# Altium footprint library ref-packages-longpad.PCBLIB: 1527 footprints (part 56 of 103)
Each footprint in its own frame and in the unit in brackets; x right, y up, seen from the top. Pads: shape width x height; smd on the part's side, far side on the other; paste and mask are expansions set on the pad; w line width, h text height; cw(c..) or ccw(c..) is an arc to the next point about the centre after c.
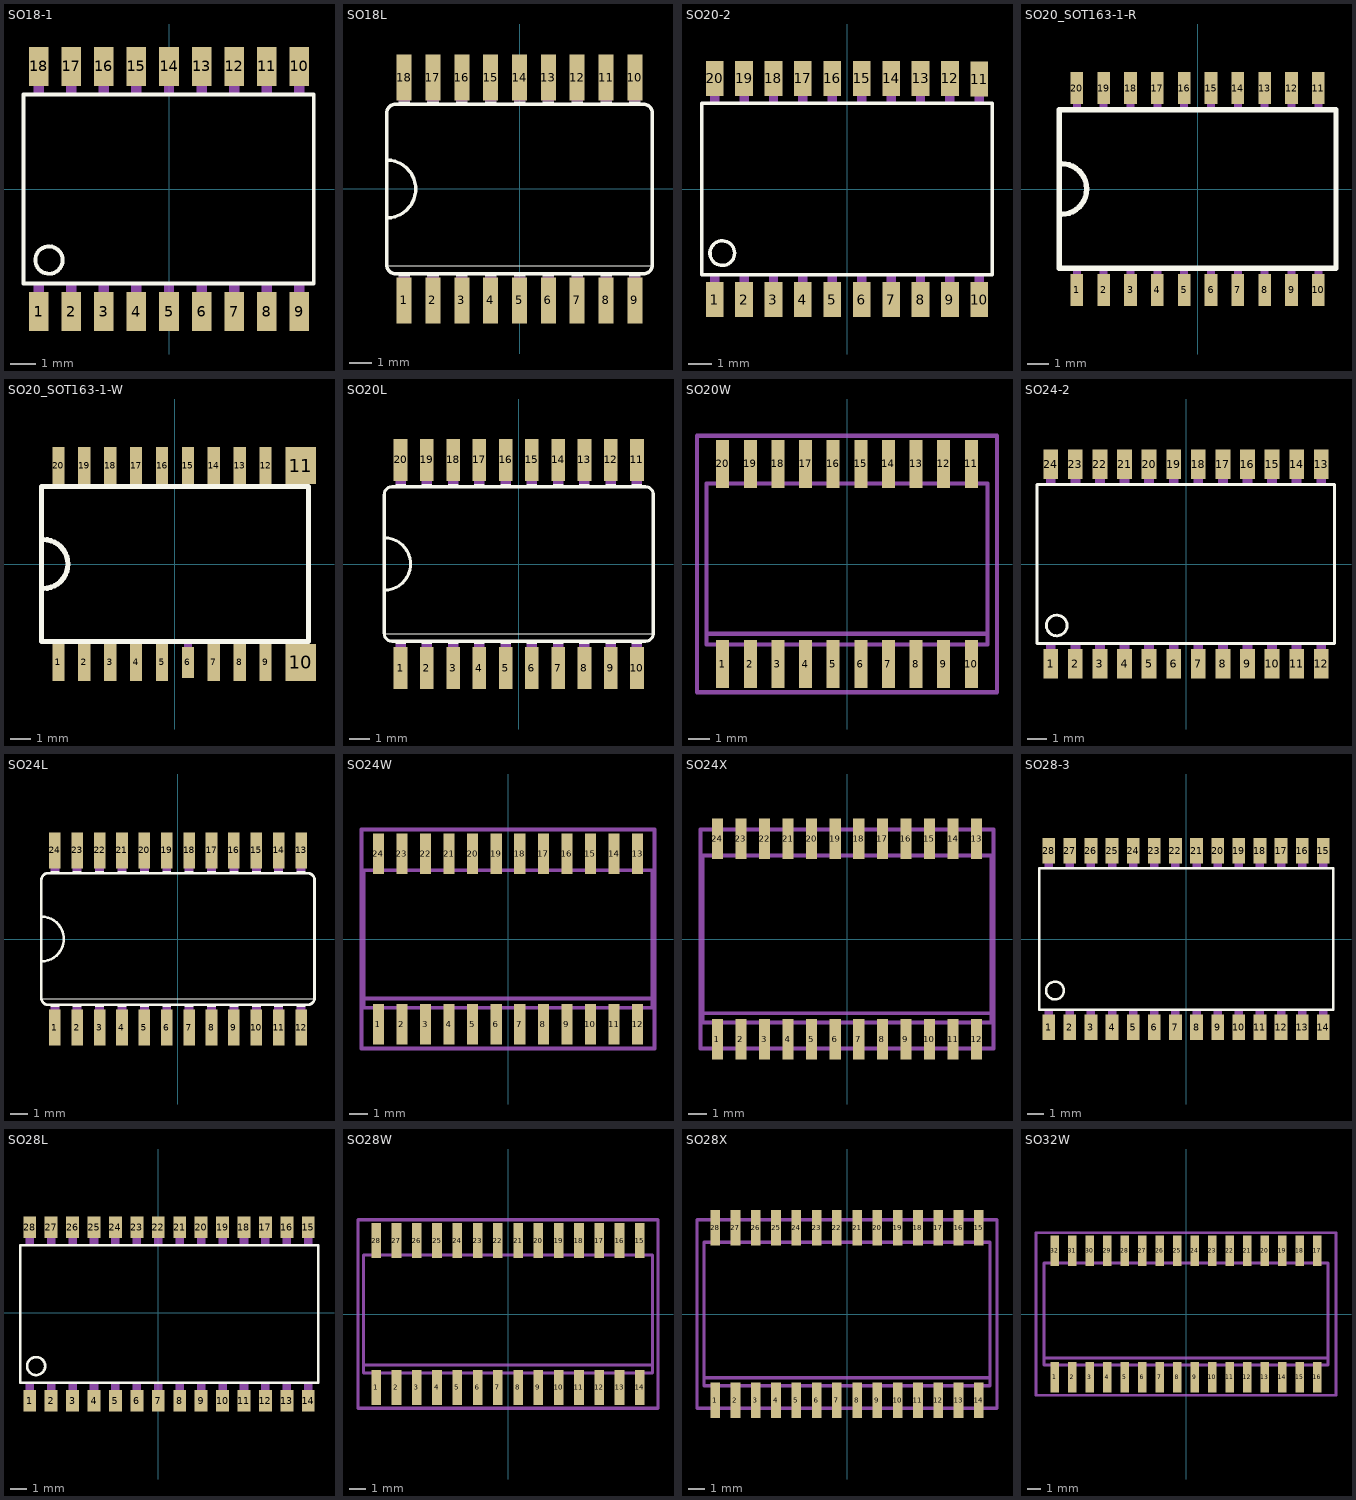
[diagram p55: the footprints below, top view; thin cyan lines are the x and y axes]

## SO18-1 [mil]
pads (18):
  rect 30x60 smd: 1(-200,-188) 2(-150,-188) 3(-100,-188) 4(-50,-188) 5(0,-188) 6(50,-188) 7(100,-188) 8(150,-188) 9(200,-188) 10(200,188) 11(150,188) 12(100,188) 13(50,188) 14(0,188) 15(-50,188) 16(-100,188) 17(-150,188) 18(-200,188)
Top Overlay:
  circle w6: c-184,-109 r21
  lines w6: -223,-145 222,-145 222,145 -223,145 -223,-145
Mechanical 16:
  rectangle: 192,147 208,200
  rectangle: 142,147 158,200
  rectangle: 92,147 108,200
  rectangle: 42,147 58,200
  rectangle: -8,147 8,200
  rectangle: -58,147 -42,200
  rectangle: -108,147 -92,200
  rectangle: -158,147 -142,200
  rectangle: -208,147 -192,200
  rectangle: -208,-200 -192,-147
  rectangle: -158,-200 -142,-147
  rectangle: -108,-200 -92,-147
  rectangle: -58,-200 -42,-147
  rectangle: -8,-200 8,-147
  rectangle: 42,-200 58,-147
  rectangle: 92,-200 108,-147
  rectangle: 142,-200 158,-147
  rectangle: 192,-200 208,-147

## SO18L [mil]
pads (18):
  rect 26x80 smd: 1(-200,-193) 2(-150,-193) 3(-100,-193) 4(-50,-193) 5(0,-193) 6(50,-193) 7(100,-193) 8(150,-193) 9(200,-193) 10(200,193) 11(150,193) 12(100,193) 13(50,193) 14(0,193) 15(-50,193) 16(-100,193) 17(-150,193) 18(-200,193)
Top Overlay:
  rectangle: -210,-152 -190,-147
  rectangle: -160,-152 -140,-147
  rectangle: -110,-152 -90,-147
  rectangle: -60,-152 -40,-147
  rectangle: -10,-152 10,-147
  rectangle: 40,-152 60,-147
  rectangle: 90,-152 110,-147
  rectangle: 140,-152 160,-147
  rectangle: -210,147 -190,152
  rectangle: -160,147 -140,152
  rectangle: -110,147 -90,152
  rectangle: -60,147 -40,152
  rectangle: -10,147 10,152
  rectangle: 40,147 60,152
  rectangle: 90,147 110,152
  rectangle: 140,147 160,152
  rectangle: 190,147 210,152
  rectangle: 190,-152 210,-147
  lines w2: -230,-133 230,-133
  lines w6: -230,-50 -230,50 ; -230,-50 -230,-132 ccw(c-215,-132) -215,-147 215,-147 ccw(c215,-132) 230,-132 230,132 ccw(c215,132) 215,147 -215,147 ccw(c-215,132) -230,132 -230,50 ; -230,-50 ccw(c-230,0) -230,50
Mechanical 16:
  rectangle: -210,-210 -190,-152
  rectangle: -160,-210 -140,-152
  rectangle: -110,-210 -90,-152
  rectangle: -60,-210 -40,-152
  rectangle: -10,-210 10,-152
  rectangle: 40,-210 60,-152
  rectangle: 90,-210 110,-152
  rectangle: 140,-210 160,-152
  rectangle: -210,152 -190,210
  rectangle: -160,152 -140,210
  rectangle: -110,152 -90,210
  rectangle: -60,152 -40,210
  rectangle: -10,152 10,210
  rectangle: 40,152 60,210
  rectangle: 90,152 110,210
  rectangle: 140,152 160,210
  rectangle: 190,152 210,210
  rectangle: 190,-210 210,-152

## SO20-2 [mil]
pads (20):
  rect 30x60 smd: 1(-225,-188) 2(-175,-188) 3(-125,-188) 4(-75,-188) 5(-25,-188) 6(25,-188) 7(75,-188) 8(125,-188) 9(175,-188) 10(225,-188) 11(225,187) 12(175,188) 13(125,188) 14(75,188) 15(25,188) 16(-25,188) 17(-75,188) 18(-125,188) 19(-175,188) 20(-225,188)
Top Overlay:
  circle w6: c-212,-109 r21
  lines w6: -247,-146 247,-146 247,146 -247,146 -247,-146
Mechanical 16:
  rectangle: 217,148 233,200
  rectangle: 167,148 183,200
  rectangle: 117,148 133,200
  rectangle: 67,148 83,200
  rectangle: 17,148 33,200
  rectangle: -33,148 -17,200
  rectangle: -83,148 -67,200
  rectangle: -133,148 -117,200
  rectangle: -183,148 -167,200
  rectangle: -233,148 -217,200
  rectangle: 217,-200 233,-148
  rectangle: 167,-200 183,-148
  rectangle: 117,-200 133,-148
  rectangle: 67,-200 83,-148
  rectangle: 17,-200 33,-148
  rectangle: -33,-200 -17,-148
  rectangle: -83,-200 -67,-148
  rectangle: -133,-200 -117,-148
  rectangle: -183,-200 -167,-148
  rectangle: -233,-200 -217,-148

## SO20_SOT163-1-R [mil]
pads (20):
  rect 23.62x59.06 smd: 1(-225,-188.19) 2(-175,-188.19) 3(-125,-188.19) 4(-75,-188.19) 5(-25,-188.19) 6(25,-188.19) 7(75,-188.19) 8(125,-188.19) 9(175,-188.19) 10(225,-188.19) 11(225,188.19) 12(175,188.19) 13(125,188.19) 14(75,188.19) 15(25,188.19) 16(-25,188.19) 17(-75,188.19) 18(-125,188.19) 19(-175,188.19) 20(-225,188.19)
Top Overlay:
  lines w10: -253.94,-47.24 ccw(c-253.94,0) -253.94,47.24 ; -257.87,-147.64 257.87,-147.64 257.87,147.64 -257.87,147.64 -257.87,-147.64
Mechanical 16:
  rectangle: -232.5,-197.5 -217.5,-152.5
  rectangle: -182.5,-197.5 -167.5,-152.5
  rectangle: -132.5,-197.5 -117.5,-152.5
  rectangle: -82.5,-197.5 -67.5,-152.5
  rectangle: -32.5,-197.5 -17.5,-152.5
  rectangle: 17.5,-197.5 32.5,-152.5
  rectangle: 67.5,-197.5 82.5,-152.5
  rectangle: 117.5,-197.5 132.5,-152.5
  rectangle: 167.5,-197.5 182.5,-152.5
  rectangle: 217.5,-197.5 232.5,-152.5
  rectangle: 217.5,152.5 232.5,197.5
  rectangle: 167.5,152.5 182.5,197.5
  rectangle: 117.5,152.5 132.5,197.5
  rectangle: 67.5,152.5 82.5,197.5
  rectangle: 17.5,152.5 32.5,197.5
  rectangle: -32.5,152.5 -17.5,197.5
  rectangle: -82.5,152.5 -67.5,197.5
  rectangle: -132.5,152.5 -117.5,197.5
  rectangle: -182.5,152.5 -167.5,197.5
  rectangle: -232.5,152.5 -217.5,197.5

## SO20_SOT163-1-W [mil]
pads (20):
  rect 23.62x70.87 smd: 1(-225,-190.16) 2(-175,-190.16) 3(-125,-190.16) 4(-75,-190.16) 5(-25,-190.16) 7(75,-190.16) 8(125,-190.16) 9(175,-190.16) 12(175,190.16) 13(125,190.16) 14(75,190.16) 15(25,190.16) 16(-25,190.16) 17(-75,190.16) 18(-125,190.16) 19(-175,190.16) 20(-225,190.16)
  rect 23.62x59.06 smd: 6(25,-190.16)
  rect 59.06x70.87 smd: 10(242.72,-190.16) 11(242.72,190.16)
Top Overlay:
  lines w10: -253.94,-47.24 ccw(c-253.94,0) -253.94,47.24 ; -257.87,-149.61 257.87,-149.61 257.87,149.61 -257.87,149.61 -257.87,-149.61
Mechanical 16:
  rectangle: -232.5,-199.47 -217.5,-154.47
  rectangle: -182.5,-199.47 -167.5,-154.47
  rectangle: -132.5,-199.47 -117.5,-154.47
  rectangle: -82.5,-199.47 -67.5,-154.47
  rectangle: -32.5,-199.47 -17.5,-154.47
  rectangle: 17.5,-199.47 32.5,-154.47
  rectangle: 67.5,-199.47 82.5,-154.47
  rectangle: 117.5,-199.47 132.5,-154.47
  rectangle: 167.5,-199.47 182.5,-154.47
  rectangle: 217.5,-199.47 232.5,-154.47
  rectangle: 217.5,154.47 232.5,199.47
  rectangle: 167.5,154.47 182.5,199.47
  rectangle: 117.5,154.47 132.5,199.47
  rectangle: 67.5,154.47 82.5,199.47
  rectangle: 17.5,154.47 32.5,199.47
  rectangle: -32.5,154.47 -17.5,199.47
  rectangle: -82.5,154.47 -67.5,199.47
  rectangle: -132.5,154.47 -117.5,199.47
  rectangle: -182.5,154.47 -167.5,199.47
  rectangle: -232.5,154.47 -217.5,199.47

## SO20L [mil]
pads (20):
  rect 26x80 smd: 1(-225,-198) 2(-175,-198) 3(-125,-198) 4(-75,-198) 5(-25,-198) 6(25,-198) 7(75,-198) 8(125,-198) 9(175,-198) 10(225,-198) 11(225,198) 12(175,198) 13(125,198) 14(75,198) 15(25,198) 16(-25,198) 17(-75,198) 18(-125,198) 19(-175,198) 20(-225,198)
Top Overlay:
  rectangle: -235,-152 -215,-147
  rectangle: -185,-152 -165,-147
  rectangle: -135,-152 -115,-147
  rectangle: -85,-152 -65,-147
  rectangle: -35,-152 -15,-147
  rectangle: 15,-152 35,-147
  rectangle: 65,-152 85,-147
  rectangle: 115,-152 135,-147
  rectangle: -235,147 -215,152
  rectangle: -185,147 -165,152
  rectangle: -135,147 -115,152
  rectangle: -85,147 -65,152
  rectangle: -35,147 -15,152
  rectangle: 15,147 35,152
  rectangle: 65,147 85,152
  rectangle: 115,147 135,152
  rectangle: 165,147 185,152
  rectangle: 215,147 235,152
  rectangle: 165,-152 185,-147
  rectangle: 215,-152 235,-147
  lines w2: -255,-133 255,-133
  lines w6: -256,-50 -256,50 ; -256,-50 -256,-132 ccw(c-241,-132) -241,-147 241,-147 ccw(c241,-132) 256,-132 256,132 ccw(c241,132) 241,147 -241,147 ccw(c-241,132) -256,132 -256,50 ; -256,-50 ccw(c-256,0) -256,50
Mechanical 16:
  rectangle: -235,-210 -215,-152
  rectangle: -185,-210 -165,-152
  rectangle: -135,-210 -115,-152
  rectangle: -85,-210 -65,-152
  rectangle: -35,-210 -15,-152
  rectangle: 15,-210 35,-152
  rectangle: 65,-210 85,-152
  rectangle: 115,-210 135,-152
  rectangle: -235,152 -215,210
  rectangle: -185,152 -165,210
  rectangle: -135,152 -115,210
  rectangle: -85,152 -65,210
  rectangle: -35,152 -15,210
  rectangle: 15,152 35,210
  rectangle: 65,152 85,210
  rectangle: 115,152 135,210
  rectangle: 165,152 185,210
  rectangle: 215,152 235,210
  rectangle: 165,-210 185,-152
  rectangle: 215,-210 235,-152

## SO20W [mil]
pads (20):
  rect 23.62x86.61 smd: 1(-225,-181.1) 2(-175,-181.1) 3(-125,-181.1) 4(-75,-181.1) 5(-25,-181.1) 6(25,-181.1) 7(75,-181.1) 8(125,-181.1) 9(175,-181.1) 10(225,-181.1) 11(225,181.1) 12(175,181.1) 13(125,181.1) 14(75,181.1) 15(25,181.1) 16(-25,181.1) 17(-75,181.1) 18(-125,181.1) 19(-175,181.1) 20(-225,181.1)
Mechanical 16:
  rectangle: -234.65,-209.45 -215.35,-149.61
  rectangle: -184.65,-209.45 -165.35,-149.61
  rectangle: -134.65,-209.45 -115.35,-149.61
  rectangle: -84.65,-209.45 -65.35,-149.61
  rectangle: -34.65,-209.45 -15.35,-149.61
  rectangle: 15.35,-209.45 34.65,-149.61
  rectangle: 65.35,-209.45 84.65,-149.61
  rectangle: 115.35,-209.45 134.65,-149.61
  rectangle: 165.35,-209.45 184.65,-149.61
  rectangle: 215.35,-209.45 234.65,-149.61
  rectangle: 215.35,149.61 234.65,209.45
  rectangle: 165.35,149.61 184.65,209.45
  rectangle: 115.35,149.61 134.65,209.45
  rectangle: 65.35,149.61 84.65,209.45
  rectangle: 15.35,149.61 34.65,209.45
  rectangle: -34.65,149.61 -15.35,209.45
  rectangle: -84.65,149.61 -65.35,209.45
  rectangle: -134.65,149.61 -115.35,209.45
  rectangle: -184.65,149.61 -165.35,209.45
  rectangle: -234.65,149.61 -215.35,209.45
  lines w8: -254.33,-125.98 -254.33,-145.67 254.33,-145.67 254.33,-125.98 ; -254.33,-125.98 -254.33,145.67 254.33,145.67 254.33,-125.98 ; -254.33,-125.98 254.33,-125.98
Mechanical 27:
  lines w7.87: -271.46,-232.28 271.46,-232.28 271.46,232.28 -271.46,232.28 -271.46,-232.28

## SO24-2 [mil]
pads (24):
  rect 30x60 smd: 1(-275,-203) 2(-225,-203) 3(-175,-203) 4(-125,-203) 5(-75,-203) 6(-25,-203) 7(25,-203) 8(75,-203) 9(125,-203) 10(175,-203) 11(225,-203) 12(275,-203) 13(275,203) 14(225,203) 15(175,203) 16(125,203) 17(75,203) 18(25,203) 19(-25,203) 20(-75,203) 21(-125,203) 22(-175,203) 23(-225,203) 24(-275,203)
Top Overlay:
  circle w6: c-263,-125 r21
  lines w6: -303,-162 302,-162 302,162 -303,162 -303,-162
Mechanical 16:
  rectangle: -285,-223 -265,-163
  rectangle: -235,-223 -215,-163
  rectangle: -185,-223 -165,-163
  rectangle: -135,-223 -115,-163
  rectangle: -85,-223 -65,-163
  rectangle: -35,-223 -15,-163
  rectangle: 15,-223 35,-163
  rectangle: 65,-223 85,-163
  rectangle: 115,-223 135,-163
  rectangle: 165,-223 185,-163
  rectangle: 215,-223 235,-163
  rectangle: 265,-223 285,-163
  rectangle: 265,163 285,223
  rectangle: 215,163 235,223
  rectangle: 165,163 185,223
  rectangle: 115,163 135,223
  rectangle: 65,163 85,223
  rectangle: 15,163 35,223
  rectangle: -35,163 -15,223
  rectangle: -85,163 -65,223
  rectangle: -135,163 -115,223
  rectangle: -185,163 -165,223
  rectangle: -235,163 -215,223
  rectangle: -285,163 -265,223

## SO24L [mil]
pads (24):
  rect 26x80 smd: 1(-275,-198) 2(-225,-198) 3(-175,-198) 4(-125,-198) 5(-75,-198) 6(-25,-198) 7(25,-198) 8(75,-198) 9(125,-198) 10(175,-198) 11(225,-198) 12(275,-198) 13(275,198) 14(225,198) 15(175,198) 16(125,198) 17(75,198) 18(25,198) 19(-25,198) 20(-75,198) 21(-125,198) 22(-175,198) 23(-225,198) 24(-275,198)
Top Overlay:
  rectangle: -285,-152 -265,-147
  rectangle: -235,-152 -215,-147
  rectangle: -185,-152 -165,-147
  rectangle: -135,-152 -115,-147
  rectangle: -85,-152 -65,-147
  rectangle: -35,-152 -15,-147
  rectangle: 15,-152 35,-147
  rectangle: 65,-152 85,-147
  rectangle: -285,147 -265,152
  rectangle: -235,147 -215,152
  rectangle: -185,147 -165,152
  rectangle: -135,147 -115,152
  rectangle: -85,147 -65,152
  rectangle: -35,147 -15,152
  rectangle: 15,147 35,152
  rectangle: 65,147 85,152
  rectangle: 115,147 135,152
  rectangle: 165,147 185,152
  rectangle: 215,147 235,152
  rectangle: 265,147 285,152
  rectangle: 115,-152 135,-147
  rectangle: 165,-152 185,-147
  rectangle: 215,-152 235,-147
  rectangle: 265,-152 285,-147
  lines w2: -305,-133 305,-133
  lines w6: -305,-50 -305,50 ; -305,-50 -305,-132 ccw(c-290,-132) -290,-147 290,-147 ccw(c290,-132) 305,-132 305,132 ccw(c290,132) 290,147 -290,147 ccw(c-290,132) -305,132 -305,50 ; -305,-50 ccw(c-305,0) -305,50
Mechanical 16:
  rectangle: -285,-210 -265,-152
  rectangle: -235,-210 -215,-152
  rectangle: -185,-210 -165,-152
  rectangle: -135,-210 -115,-152
  rectangle: -85,-210 -65,-152
  rectangle: -35,-210 -15,-152
  rectangle: 15,-210 35,-152
  rectangle: 65,-210 85,-152
  rectangle: -285,152 -265,210
  rectangle: -235,152 -215,210
  rectangle: -185,152 -165,210
  rectangle: -135,152 -115,210
  rectangle: -85,152 -65,210
  rectangle: -35,152 -15,210
  rectangle: 15,152 35,210
  rectangle: 65,152 85,210
  rectangle: 115,152 135,210
  rectangle: 165,152 185,210
  rectangle: 215,152 235,210
  rectangle: 265,152 285,210
  rectangle: 115,-210 135,-152
  rectangle: 165,-210 185,-152
  rectangle: 215,-210 235,-152
  rectangle: 265,-210 285,-152

## SO24W [mil]
pads (24):
  rect 23.62x86.61 smd: 1(-275,-181.1) 2(-225,-181.1) 3(-175,-181.1) 4(-125,-181.1) 5(-75,-181.1) 6(-25,-181.1) 7(25,-181.1) 8(75,-181.1) 9(125,-181.1) 10(175,-181.1) 11(225,-181.1) 12(275,-181.1) 13(275,181.1) 14(225,181.1) 15(175,181.1) 16(125,181.1) 17(75,181.1) 18(25,181.1) 19(-25,181.1) 20(-75,181.1) 21(-125,181.1) 22(-175,181.1) 23(-225,181.1) 24(-275,181.1)
Mechanical 16:
  rectangle: -284.65,-209.45 -265.35,-149.61
  rectangle: -234.65,-209.45 -215.35,-149.61
  rectangle: -184.65,-209.45 -165.35,-149.61
  rectangle: -134.65,-209.45 -115.35,-149.61
  rectangle: -84.65,-209.45 -65.35,-149.61
  rectangle: -34.65,-209.45 -15.35,-149.61
  rectangle: 15.35,-209.45 34.65,-149.61
  rectangle: 65.35,-209.45 84.65,-149.61
  rectangle: 115.35,-209.45 134.65,-149.61
  rectangle: 165.35,-209.45 184.65,-149.61
  rectangle: 215.35,-209.45 234.65,-149.61
  rectangle: 265.35,-209.45 284.65,-149.61
  rectangle: 265.35,149.61 284.65,209.45
  rectangle: 215.35,149.61 234.65,209.45
  rectangle: 165.35,149.61 184.65,209.45
  rectangle: 115.35,149.61 134.65,209.45
  rectangle: 65.35,149.61 84.65,209.45
  rectangle: 15.35,149.61 34.65,209.45
  rectangle: -34.65,149.61 -15.35,209.45
  rectangle: -84.65,149.61 -65.35,209.45
  rectangle: -134.65,149.61 -115.35,209.45
  rectangle: -184.65,149.61 -165.35,209.45
  rectangle: -234.65,149.61 -215.35,209.45
  rectangle: -284.65,149.61 -265.35,209.45
  lines w8: -306.3,-125.98 -306.3,-145.67 306.3,-145.67 306.3,-125.98 ; -306.3,-125.98 -306.3,145.67 306.3,145.67 306.3,-125.98 ; -306.3,-125.98 306.3,-125.98
Mechanical 27:
  lines w7.87: -310.83,-232.28 310.83,-232.28 310.83,232.28 -310.83,232.28 -310.83,-232.28

## SO24X [mil]
pads (24):
  rect 23.62x86.61 smd: 1(-275,-212.6) 2(-225,-212.6) 3(-175,-212.6) 4(-125,-212.6) 5(-75,-212.6) 6(-25,-212.6) 7(25,-212.6) 8(75,-212.6) 9(125,-212.6) 10(175,-212.6) 11(225,-212.6) 12(275,-212.6) 13(275,212.6) 14(225,212.6) 15(175,212.6) 16(125,212.6) 17(75,212.6) 18(25,212.6) 19(-25,212.6) 20(-75,212.6) 21(-125,212.6) 22(-175,212.6) 23(-225,212.6) 24(-275,212.6)
Mechanical 16:
  rectangle: -284.65,-240.94 -265.35,-181.1
  rectangle: -234.65,-240.94 -215.35,-181.1
  rectangle: -184.65,-240.94 -165.35,-181.1
  rectangle: -134.65,-240.94 -115.35,-181.1
  rectangle: -84.65,-240.94 -65.35,-181.1
  rectangle: -34.65,-240.94 -15.35,-181.1
  rectangle: 15.35,-240.94 34.65,-181.1
  rectangle: 65.35,-240.94 84.65,-181.1
  rectangle: 115.35,-240.94 134.65,-181.1
  rectangle: 165.35,-240.94 184.65,-181.1
  rectangle: 215.35,-240.94 234.65,-181.1
  rectangle: 265.35,-240.94 284.65,-181.1
  rectangle: 265.35,181.1 284.65,240.94
  rectangle: 215.35,181.1 234.65,240.94
  rectangle: 165.35,181.1 184.65,240.94
  rectangle: 115.35,181.1 134.65,240.94
  rectangle: 65.35,181.1 84.65,240.94
  rectangle: 15.35,181.1 34.65,240.94
  rectangle: -34.65,181.1 -15.35,240.94
  rectangle: -84.65,181.1 -65.35,240.94
  rectangle: -134.65,181.1 -115.35,240.94
  rectangle: -184.65,181.1 -165.35,240.94
  rectangle: -234.65,181.1 -215.35,240.94
  rectangle: -284.65,181.1 -265.35,240.94
  lines w8: -306.3,-157.48 -306.3,-177.17 306.3,-177.17 306.3,-157.48 ; -306.3,-157.48 -306.3,177.17 306.3,177.17 306.3,-157.48 ; -306.3,-157.48 306.3,-157.48
Mechanical 27:
  lines w7.87: -310.83,-232.28 310.83,-232.28 310.83,232.28 -310.83,232.28 -310.83,-232.28

## SO28-3 [mil]
pads (28):
  rect 30x60 smd: 1(-325,-209.25) 2(-275,-209.25) 3(-225,-209.25) 4(-175,-209.25) 5(-125,-209.25) 6(-75,-209.25) 7(-25,-209.25) 8(25,-209.25) 9(75,-209.25) 10(125,-209.25) 11(175,-209.25) 12(225,-209.25) 13(275,-209.25) 14(325,-209.25) 15(325,209.25) 16(275,209.25) 17(225,209.25) 18(175,209.25) 19(125,209.25) 20(75,209.25) 21(25,209.25) 22(-25,209.25) 23(-75,209.25) 24(-125,209.25) 25(-175,209.25) 26(-225,209.25) 27(-275,209.25) 28(-325,209.25)
Top Overlay:
  circle w6: c-310,-122 r21
  lines w6: -347.01,-167.24 347.99,-167.24 347.99,167.24 -347.01,167.24 -347.01,-167.24
Mechanical 16:
  rectangle: -335,-228.25 -315,-168.25
  rectangle: -285,-228.25 -265,-168.25
  rectangle: -235,-228.25 -215,-168.25
  rectangle: -185,-228.25 -165,-168.25
  rectangle: -135,-228.25 -115,-168.25
  rectangle: -85,-228.25 -65,-168.25
  rectangle: -35,-228.25 -15,-168.25
  rectangle: 15,-228.25 35,-168.25
  rectangle: 65,-228.25 85,-168.25
  rectangle: 115,-228.25 135,-168.25
  rectangle: 165,-228.25 185,-168.25
  rectangle: 215,-228.25 235,-168.25
  rectangle: 265,-228.25 285,-168.25
  rectangle: 315,-228.25 335,-168.25
  rectangle: 315,168.25 335,228.25
  rectangle: 265,168.25 285,228.25
  rectangle: 215,168.25 235,228.25
  rectangle: 165,168.25 185,228.25
  rectangle: 115,168.25 135,228.25
  rectangle: 65,168.25 85,228.25
  rectangle: 15,168.25 35,228.25
  rectangle: -35,168.25 -15,228.25
  rectangle: -85,168.25 -65,228.25
  rectangle: -135,168.25 -115,228.25
  rectangle: -185,168.25 -165,228.25
  rectangle: -235,168.25 -215,228.25
  rectangle: -285,168.25 -265,228.25
  rectangle: -335,168.25 -315,228.25

## SO28L [mil]
pads (28):
  rect 30x50 smd: 1(-300,-205) 2(-250,-205) 3(-200,-205) 4(-150,-205) 5(-100,-205) 6(-50,-205) 7(0,-205) 8(50,-205) 9(100,-205) 10(150,-205) 11(200,-205) 12(250,-205) 13(300,-205) 14(350,-205) 15(350,200) 16(300,200) 17(250,200) 18(200,200) 19(150,200) 20(100,200) 21(50,200) 22(0,200) 23(-50,200) 24(-100,200) 25(-150,200) 26(-200,200) 27(-250,200) 28(-300,200)
Top Overlay:
  circle w6: c-285,-124 r21
  lines w6: -322,-163 373,-163 373,158 -322,158 -322,-163
Mechanical 16:
  rectangle: -310,-224 -290,-164
  rectangle: -260,-224 -240,-164
  rectangle: -210,-224 -190,-164
  rectangle: -160,-224 -140,-164
  rectangle: -110,-224 -90,-164
  rectangle: -60,-224 -40,-164
  rectangle: -10,-224 10,-164
  rectangle: 40,-224 60,-164
  rectangle: 90,-224 110,-164
  rectangle: 140,-224 160,-164
  rectangle: 190,-224 210,-164
  rectangle: 240,-224 260,-164
  rectangle: 290,-224 310,-164
  rectangle: 340,-224 360,-164
  rectangle: 340,159 360,219
  rectangle: 290,159 310,219
  rectangle: 240,159 260,219
  rectangle: 190,159 210,219
  rectangle: 140,159 160,219
  rectangle: 90,159 110,219
  rectangle: 40,159 60,219
  rectangle: -10,159 10,219
  rectangle: -60,159 -40,219
  rectangle: -110,159 -90,219
  rectangle: -160,159 -140,219
  rectangle: -210,159 -190,219
  rectangle: -260,159 -240,219
  rectangle: -310,159 -290,219

## SO28W [mil]
pads (28):
  rect 23.62x86.61 smd: 1(-325,-181.1) 2(-275,-181.1) 3(-225,-181.1) 4(-175,-181.1) 5(-125,-181.1) 6(-75,-181.1) 7(-25,-181.1) 8(25,-181.1) 9(75,-181.1) 10(125,-181.1) 11(175,-181.1) 12(225,-181.1) 13(275,-181.1) 14(325,-181.1) 15(325,181.1) 16(275,181.1) 17(225,181.1) 18(175,181.1) 19(125,181.1) 20(75,181.1) 21(25,181.1) 22(-25,181.1) 23(-75,181.1) 24(-125,181.1) 25(-175,181.1) 26(-225,181.1) 27(-275,181.1) 28(-325,181.1)
Mechanical 16:
  rectangle: -334.65,-209.45 -315.35,-149.61
  rectangle: -284.65,-209.45 -265.35,-149.61
  rectangle: -234.65,-209.45 -215.35,-149.61
  rectangle: -184.65,-209.45 -165.35,-149.61
  rectangle: -134.65,-209.45 -115.35,-149.61
  rectangle: -84.65,-209.45 -65.35,-149.61
  rectangle: -34.65,-209.45 -15.35,-149.61
  rectangle: 15.35,-209.45 34.65,-149.61
  rectangle: 65.35,-209.45 84.65,-149.61
  rectangle: 115.35,-209.45 134.65,-149.61
  rectangle: 165.35,-209.45 184.65,-149.61
  rectangle: 215.35,-209.45 234.65,-149.61
  rectangle: 265.35,-209.45 284.65,-149.61
  rectangle: 315.35,-209.45 334.65,-149.61
  rectangle: 315.35,149.61 334.65,209.45
  rectangle: 265.35,149.61 284.65,209.45
  rectangle: 215.35,149.61 234.65,209.45
  rectangle: 165.35,149.61 184.65,209.45
  rectangle: 115.35,149.61 134.65,209.45
  rectangle: 65.35,149.61 84.65,209.45
  rectangle: 15.35,149.61 34.65,209.45
  rectangle: -34.65,149.61 -15.35,209.45
  rectangle: -84.65,149.61 -65.35,209.45
  rectangle: -134.65,149.61 -115.35,209.45
  rectangle: -184.65,149.61 -165.35,209.45
  rectangle: -234.65,149.61 -215.35,209.45
  rectangle: -284.65,149.61 -265.35,209.45
  rectangle: -334.65,149.61 -315.35,209.45
  lines w8: -356.3,-125.98 -356.3,-145.67 356.3,-145.67 356.3,-125.98 ; -356.3,-125.98 -356.3,145.67 356.3,145.67 356.3,-125.98 ; -356.3,-125.98 356.3,-125.98
Mechanical 27:
  lines w7.87: -369.88,-232.28 369.88,-232.28 369.88,232.28 -369.88,232.28 -369.88,-232.28

## SO28X [mil]
pads (28):
  rect 23.62x86.61 smd: 1(-325,-212.6) 2(-275,-212.6) 3(-225,-212.6) 4(-175,-212.6) 5(-125,-212.6) 6(-75,-212.6) 7(-25,-212.6) 8(25,-212.6) 9(75,-212.6) 10(125,-212.6) 11(175,-212.6) 12(225,-212.6) 13(275,-212.6) 14(325,-212.6) 15(325,212.6) 16(275,212.6) 17(225,212.6) 18(175,212.6) 19(125,212.6) 20(75,212.6) 21(25,212.6) 22(-25,212.6) 23(-75,212.6) 24(-125,212.6) 25(-175,212.6) 26(-225,212.6) 27(-275,212.6) 28(-325,212.6)
Mechanical 16:
  rectangle: -334.65,-240.94 -315.35,-181.1
  rectangle: -284.65,-240.94 -265.35,-181.1
  rectangle: -234.65,-240.94 -215.35,-181.1
  rectangle: -184.65,-240.94 -165.35,-181.1
  rectangle: -134.65,-240.94 -115.35,-181.1
  rectangle: -84.65,-240.94 -65.35,-181.1
  rectangle: -34.65,-240.94 -15.35,-181.1
  rectangle: 15.35,-240.94 34.65,-181.1
  rectangle: 65.35,-240.94 84.65,-181.1
  rectangle: 115.35,-240.94 134.65,-181.1
  rectangle: 165.35,-240.94 184.65,-181.1
  rectangle: 215.35,-240.94 234.65,-181.1
  rectangle: 265.35,-240.94 284.65,-181.1
  rectangle: 315.35,-240.94 334.65,-181.1
  rectangle: 315.35,181.1 334.65,240.94
  rectangle: 265.35,181.1 284.65,240.94
  rectangle: 215.35,181.1 234.65,240.94
  rectangle: 165.35,181.1 184.65,240.94
  rectangle: 115.35,181.1 134.65,240.94
  rectangle: 65.35,181.1 84.65,240.94
  rectangle: 15.35,181.1 34.65,240.94
  rectangle: -34.65,181.1 -15.35,240.94
  rectangle: -84.65,181.1 -65.35,240.94
  rectangle: -134.65,181.1 -115.35,240.94
  rectangle: -184.65,181.1 -165.35,240.94
  rectangle: -234.65,181.1 -215.35,240.94
  rectangle: -284.65,181.1 -265.35,240.94
  rectangle: -334.65,181.1 -315.35,240.94
  lines w8: -352.36,-157.48 -352.36,-177.17 352.36,-177.17 352.36,-157.48 ; -352.36,-157.48 -352.36,177.17 352.36,177.17 352.36,-157.48 ; -352.36,-157.48 352.36,-157.48
Mechanical 27:
  lines w7.87: -369.88,-232.28 369.88,-232.28 369.88,232.28 -369.88,232.28 -369.88,-232.28

## SO32W [mil]
pads (32):
  rect 23.62x86.61 smd: 1(-375,-181.1) 2(-325,-181.1) 3(-275,-181.1) 4(-225,-181.1) 5(-175,-181.1) 6(-125,-181.1) 7(-75,-181.1) 8(-25,-181.1) 9(25,-181.1) 10(75,-181.1) 11(125,-181.1) 12(175,-181.1) 13(225,-181.1) 14(275,-181.1) 15(325,-181.1) 16(375,-181.1) 17(375,181.1) 18(325,181.1) 19(275,181.1) 20(225,181.1) 21(175,181.1) 22(125,181.1) 23(75,181.1) 24(25,181.1) 25(-25,181.1) 26(-75,181.1) 27(-125,181.1) 28(-175,181.1) 29(-225,181.1) 30(-275,181.1) 31(-325,181.1) 32(-375,181.1)
Mechanical 16:
  rectangle: -384.65,-209.45 -365.35,-149.61
  rectangle: -334.65,-209.45 -315.35,-149.61
  rectangle: -284.65,-209.45 -265.35,-149.61
  rectangle: -234.65,-209.45 -215.35,-149.61
  rectangle: -184.65,-209.45 -165.35,-149.61
  rectangle: -134.65,-209.45 -115.35,-149.61
  rectangle: -84.65,-209.45 -65.35,-149.61
  rectangle: -34.65,-209.45 -15.35,-149.61
  rectangle: 15.35,-209.45 34.65,-149.61
  rectangle: 65.35,-209.45 84.65,-149.61
  rectangle: 115.35,-209.45 134.65,-149.61
  rectangle: 165.35,-209.45 184.65,-149.61
  rectangle: 215.35,-209.45 234.65,-149.61
  rectangle: 265.35,-209.45 284.65,-149.61
  rectangle: 315.35,-209.45 334.65,-149.61
  rectangle: 365.35,-209.45 384.65,-149.61
  rectangle: 365.35,149.61 384.65,209.45
  rectangle: 315.35,149.61 334.65,209.45
  rectangle: 265.35,149.61 284.65,209.45
  rectangle: 215.35,149.61 234.65,209.45
  rectangle: 165.35,149.61 184.65,209.45
  rectangle: 115.35,149.61 134.65,209.45
  rectangle: 65.35,149.61 84.65,209.45
  rectangle: 15.35,149.61 34.65,209.45
  rectangle: -34.65,149.61 -15.35,209.45
  rectangle: -84.65,149.61 -65.35,209.45
  rectangle: -134.65,149.61 -115.35,209.45
  rectangle: -184.65,149.61 -165.35,209.45
  rectangle: -234.65,149.61 -215.35,209.45
  rectangle: -284.65,149.61 -265.35,209.45
  rectangle: -334.65,149.61 -315.35,209.45
  rectangle: -384.65,149.61 -365.35,209.45
  lines w8: -406.3,-125.98 -406.3,-145.67 406.3,-145.67 406.3,-125.98 ; -406.3,-125.98 -406.3,145.67 406.3,145.67 406.3,-125.98 ; -406.3,-125.98 406.3,-125.98
Mechanical 27:
  lines w7.87: -428.94,-232.28 428.94,-232.28 428.94,232.28 -428.94,232.28 -428.94,-232.28